# Altium footprint library BARKO_PCBLIB.PcbLib: 531 footprints (part 27 of 34)
Each footprint in its own frame and in the unit in brackets; x right, y up, seen from the top. Pads: shape width x height; smd on the part's side, far side on the other; paste and mask are expansions set on the pad; w line width, h text height; cw(c..) or ccw(c..) is an arc to the next point about the centre after c.
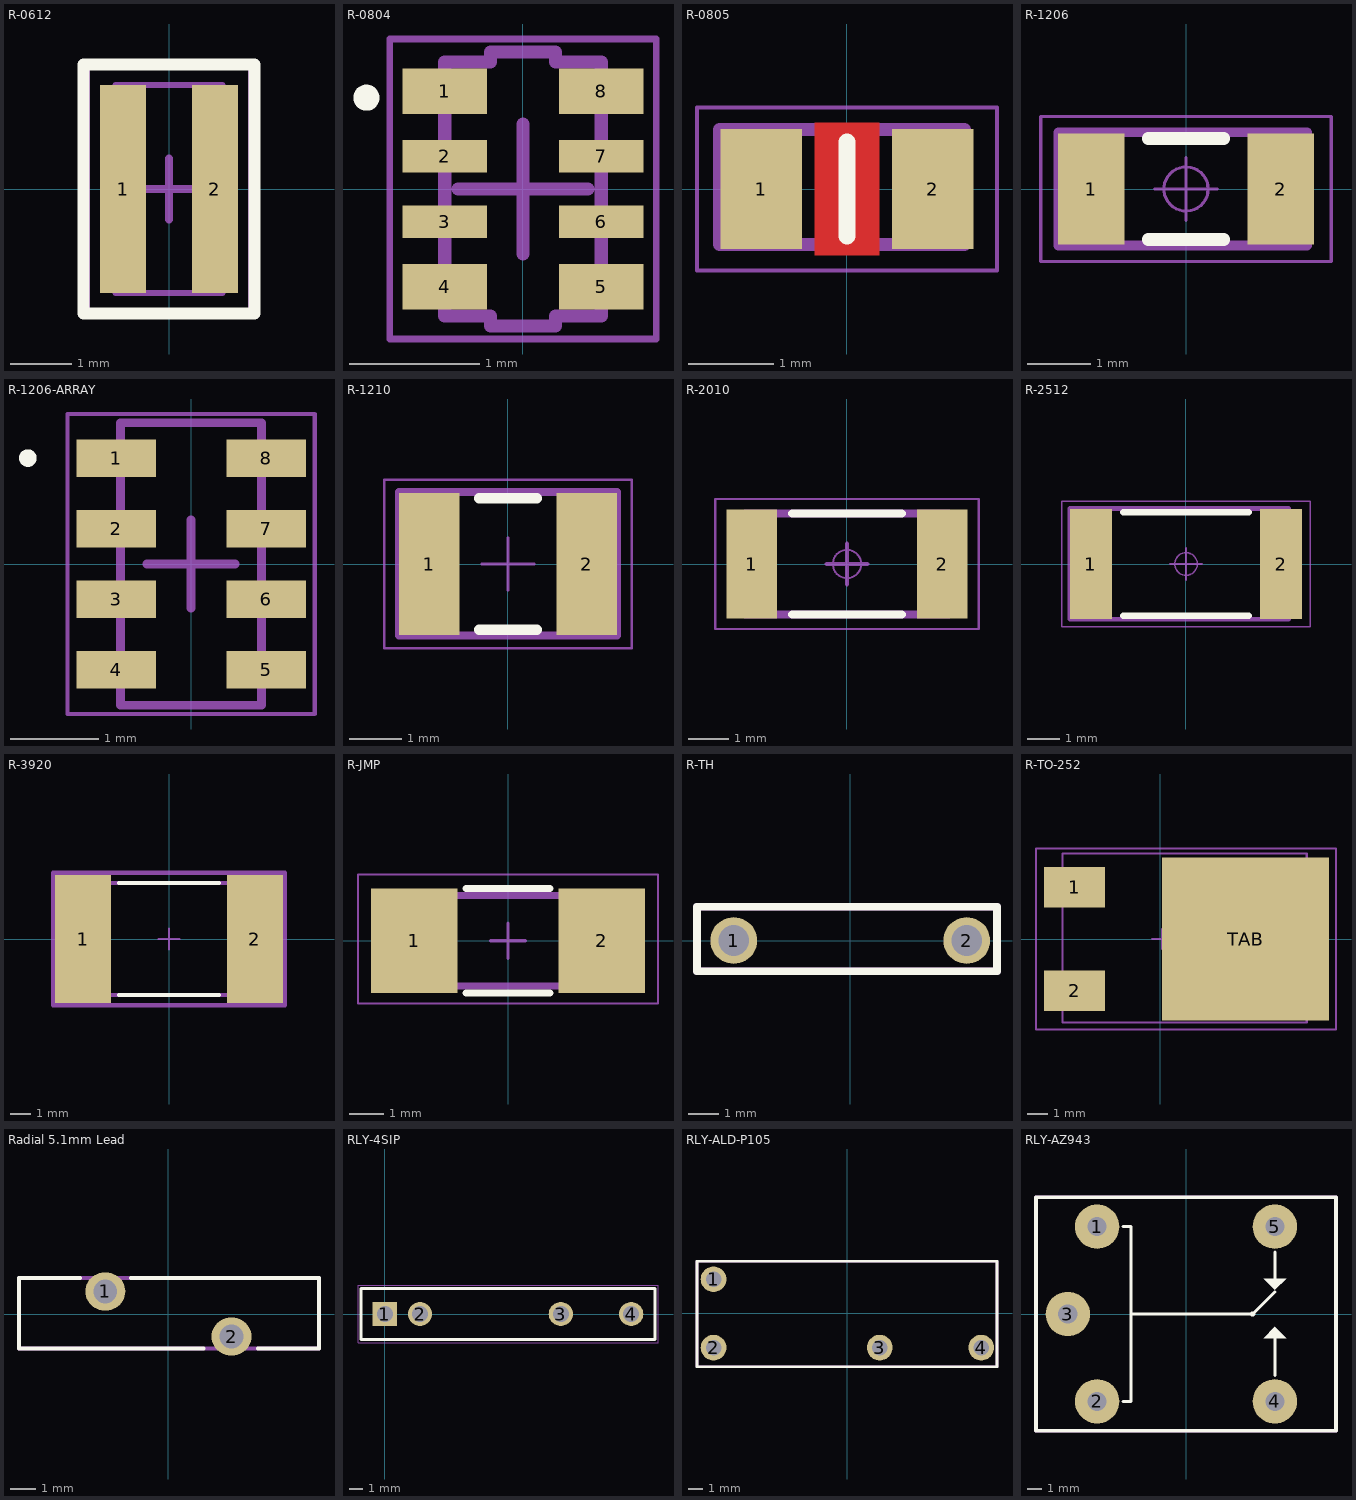
[diagram p26: the footprints below, top view; thin cyan lines are the x and y axes]

## R-0612 [mm] "Chip Resistor, 2-Leads, Body 1,60x3,20mm, IPC Medium Density"
height 0.6
pads (2):
  rect 0.75x3.4 smd: 1(-0.75,0) 2(0.75,0)
Top Overlay:
  lines w0.2: -1.397,-2.032 1.397,-2.032 1.397,2.032 -1.397,2.032 -1.397,-2.032
Mechanical 15:
  lines w0.127: -0.5,0 0.5,0 ; 0,-0.5 0,0.5 ; -1.35,-2.032 1.35,-2.032 1.35,2.032 -1.35,2.032 -1.35,-2.032
ASM Top:
  lines w0.1: -0.875,-1.7 -0.875,1.7 0.875,1.7 0.875,-1.7 -0.875,-1.7
  text ".designator" at 0,-0.186 h0.8
3D body "0612.step": height 0.6, standoff 0, extent -0.875,-1.7 0.875,1.7

## R-0804 [mm] "SMD, 8-Leads, Body 2x1mm, Pitch 0.5mm"
height 0.45
pads (8):
  rect 0.65x0.35 smd mask+0.05: 1(-0.6,0.75) 4(-0.6,-0.75) 5(0.6,-0.75) 8(0.6,0.75)
  rect 0.65x0.25 smd mask+0.05: 2(-0.6,0.25) 3(-0.6,-0.25) 6(0.6,-0.25) 7(0.6,0.25)
Top Overlay:
  circle w0.1: c-1.2,0.7 r0.05
Mechanical 15:
  lines w0.05: -1.02,-1.15 -1.02,1.15 1.02,1.15 1.02,-1.15 -1.02,-1.15
  lines w0.1: -0.5,0 0.5,0 ; 0,-0.5 0,0.5
ASM Top:
  lines w0.1: -0.6,-0.975 -0.6,0.975 -0.25,0.975 -0.25,1.05 0.25,1.05 0.25,0.975 0.6,0.975 0.6,-0.975 0.25,-0.975 0.25,-1.05 -0.25,-1.05 -0.25,-0.975 -0.6,-0.975
  text ".designator" at -0.595,-0.194 h1.2
3D body "CAC-50P200X100-8L.step": height 0.45, standoff 0, extent -0.6,-1.05 0.6,1.05

## R-0805 [mm]
pads (2):
  rect 0.95x1.4 smd: 1(-1,0) 2(1,0)
Top Layer:
  pour cut-out: -0.375,0.775 -0.375,-0.775 0.375,-0.775 0.375,0.775
Top Overlay:
  lines w0.2: 0,-0.55 0,0.55
Mechanical 15:
  lines w0.05: -0.3,0 0.3,0 ; 0,-0.3 0,0.3 ; -1.75,-0.95 -1.75,0.95 1.75,0.95 1.75,-0.95 -1.75,-0.95
ASM Top:
  lines w0.152: -1.488,-0.647 1.371,-0.647 1.371,0.696 -1.488,0.696 -1.488,-0.647
  text ".designator" at -0.776,-0.303 h0.8
3D body "User Library-RES_2013-0805.STEP": height 0.77, standoff 0.01, extent -1.15,-0.675 1.15,0.675

## R-1206 [mm]
pads (2):
  rect 1.05x1.75 smd: 1(-1.5,0.001) 2(1.5,0.001)
Top Overlay:
  lines w0.2: -0.6,-0.799 0.6,-0.799 ; -0.6,0.801 0.6,0.801
Mechanical 15:
  circle w0.05: c0,0.001 r0.35
  lines w0.05: -0.5,0.001 0.5,0.001 ; 0,-0.499 0,0.501 ; -2.3,-1.149 -2.3,1.151 2.3,1.151 2.3,-1.149 -2.3,-1.149
ASM Top:
  lines w0.152: -2.025,-0.894 1.917,-0.894 1.917,0.901 -2.025,0.901 -2.025,-0.894
  text ".designator" at -0.733,-0.291 h0.8
3D body "User Library-RES_3216-1206.STEP": height 0.86, standoff 0.01, extent -1.675,-0.864 1.675,0.866

## R-1206-ARRAY [mm] "SMD, 8-Leads, Body 1.6x3.2mm, Pitch 0.8mm"
height 0.6
pads (8):
  rect 0.9x0.425 smd: 1(-0.85,1.2) 2(-0.85,0.4) 3(-0.85,-0.4) 4(-0.85,-1.2) 5(0.85,-1.2) 6(0.85,-0.4) 7(0.85,0.4) 8(0.85,1.2)
Top Overlay:
  circle w0.1: c-1.85,1.2 r0.05
Mechanical 15:
  lines w0.05: -1.4,-1.7 -1.4,1.7 1.4,1.7 1.4,-1.7 -1.4,-1.7
  lines w0.1: -0.5,0 0.5,0 ; 0,-0.5 0,0.5
ASM Top:
  lines w0.1: -0.8,-1.6 -0.8,1.6 0.8,1.6 0.8,-1.6 -0.8,-1.6
  text ".designator" at -0.399,-0.194 h1.2
3D body "BOUR-CAY16-J4-8.stp": height 0.6, standoff 0, extent -0.8,-1.6 0.8,1.6

## R-1210 [mm]
pads (2):
  rect 1.15x2.7 smd: 1(-1.5,0) 2(1.5,0)
Top Overlay:
  lines w0.2: -0.55,-1.25 0.55,-1.25 ; -0.55,1.25 0.55,1.25
Mechanical 15:
  lines w0.05: -0.5,0 0.5,0 ; 0,-0.5 0,0.5 ; -2.35,-1.6 2.35,-1.6 2.35,1.6 -2.35,1.6 -2.35,-1.6
ASM Top:
  lines w0.152: -2.075,-1.358 2.075,-1.358 2.075,1.367 -2.075,1.367 -2.075,-1.358
  text ".designator" at -0.499,-0.247 h0.8
3D body "User Library-SMD RESISTOR-1.STEP": height 0.61, standoff 0.01, extent -1.6,-1.25 1.6,1.25

## R-2010 [mm]
height 0.65
pads (2):
  rect 1.25x2.7 smd: 1(-2.35,0) 2(2.35,0)
Top Overlay:
  lines w0.2: -1.35,-1.25 1.35,-1.25 ; -1.35,1.25 1.35,1.25
Mechanical 15:
  circle w0.05: c0,0 r0.35
  lines w0.05: -0.5,0 0.5,0 ; 0,-0.5 0,0.5 ; -3.25,-1.6 3.25,-1.6 3.25,1.6 -3.25,1.6 -3.25,-1.6
Mechanical 16:
  lines w0.1: -0.5,0 0.5,0 ; 0,-0.5 0,0.5
ASM Top:
  lines w0.2: -2.5,-1.25 -2.5,1.25 2.5,1.25 2.5,-1.25 -2.5,-1.25
  text ".designator" at -0.47,-0.181 h0.8
3D body "Res_TE_CRGP2010F820K_eec.STEP": height 0.65, standoff 0, extent -2.5,-1.25 2.5,1.25

## R-2512 [mm]
pads (2):
  rect 1.3x3.4 smd: 1(-2.95,0) 2(2.95,0)
Top Overlay:
  lines w0.2: -1.95,-1.6 1.95,-1.6 ; -1.95,1.6 1.95,1.6
Mechanical 15:
  circle w0.05: c0,0 r0.35
  lines w0.05: -0.5,0 0.5,0 ; 0,-0.5 0,0.5 ; -3.85,-1.95 3.85,-1.95 3.85,1.95 -3.85,1.95 -3.85,-1.95
ASM Top:
  lines w0.152: -3.6,-1.712 3.185,-1.712 3.185,1.725 -3.6,1.725 -3.6,-1.712
  text ".designator" at -0.85,-0.429 h0.8
3D body "RESC6332X80N.stp": height 0.8, standoff 0, extent -3.125,-1.6 3.125,1.6

## R-3920 [mm]
pads (2):
  rect 2.7x6.2 smd paste+0 mask+0: 1(-4.15,0) 2(4.15,0)
Top Overlay:
  lines w0.2: -2.425,-2.7 2.425,-2.7 ; -2.425,2.7 2.425,2.7
Mechanical 15:
  lines w0.2: -5.6,-3.2 5.6,-3.2 5.6,3.2 -5.6,3.2 -5.6,-3.2
Mechanical 16:
  lines w0.1: -0.5,0 0.5,0 ; 0,-0.5 0,0.5
ASM Top:
  lines w0.2: -5.2,-2.7 -5.2,2.7 5.2,2.7 5.2,-2.7 -5.2,-2.7
  text ".Designator" at 0,0.188 h1
3D body "Res_Stackpole_Electronics_HCS3920FT1L00_eec.STEP": height 1.07, standoff 0, extent -5.1,-2.6 5.1,2.6

## R-JMP [mm] "Chip Resistor, 2-Leads, Body 6.85x2.00mm, IPC Medium Density"
height 0.97
pads (2):
  rect 2.475x3 smd: 1(-2.688,0) 2(2.688,0)
Top Overlay:
  lines w0.2: -1.2,-1.5 1.2,-1.5 ; -1.2,1.5 1.2,1.5
Mechanical 15:
  lines w0.05: -4.3,-1.8 4.3,-1.8 4.3,1.9 -4.3,1.9 -4.3,-1.8
  lines w0.1: -0.5,0 0.5,0 ; 0,-0.5 0,0.5
ASM Top:
  lines w0.2: -3.4,-1.3 3.3,-1.3 3.3,1.3 3.1,1.3 -3.4,1.3 -3.4,-1.3
  text ".designator" at -0.5,-0.3 h0.8
3D body "s1911-46r.stp": height 0.98, standoff 0.01, extent -3.425,-1.25 3.425,1.257

## R-TH [mil]
pads (2):
  round 60 hole 39.37: 1(-149.61,0) 2(150,0)
Top Overlay:
  lines w10: -196.85,-39.37 -196.85,43.31 188.98,43.31 188.98,-39.37 -196.85,-39.37
Bottom Overlay:
  lines w10: -196.85,-39.37 -196.85,43.31 188.98,43.31 188.98,-39.37 -196.85,-39.37
Top 3D Body:
  lines w10: -196.85,-39.37 -196.85,0 -196.85,43.31 188.98,43.31 188.98,-39.37 -196.85,-39.37
ASM Top:
  lines w5.91: -196.85,-39.37 188.98,-39.37 188.98,43.31 -196.85,43.31 -196.85,-39.37
  text ".designator" at -31.5,-11.81 h31.5
3D body "CircuitWorks-RESISTOR 7_62MM DIP.STEP": height 157.98, standoff 0.5, extent -157.48,-39.37 161.42,39.37

## R-TO-252 [mm]
pads (3):
  rect 3x2 smd paste-0.05: 1(-4.2,2.54) 2(-4.2,-2.54)
  rect 8.2x8 smd paste-10: TAB(4.2,0)
Top Paste:
  rectangle: 5.715,2.159 8.128,3.683
  rectangle: 5.715,0.212 8.128,1.736
  rectangle: 5.715,-1.736 8.128,-0.212
  rectangle: 5.715,-3.683 8.128,-2.159
  rectangle: 2.984,2.159 5.397,3.683
  rectangle: 2.984,0.212 5.397,1.736
  rectangle: 2.984,-1.736 5.397,-0.212
  rectangle: 2.984,-3.683 5.397,-2.159
  rectangle: 0.254,-3.683 2.667,-2.159
  rectangle: 0.254,-1.736 2.667,-0.212
  rectangle: 0.254,0.212 2.667,1.736
  rectangle: 0.254,2.159 2.667,3.683
Mechanical 15:
  lines w0.1: -0.4,0 0.6,0 ; 0.1,-0.5 0.1,0.5 ; -6.096,-4.445 8.636,-4.445 8.636,4.445 -6.096,4.445 -6.096,-4.445
ASM Top:
  lines w0.1: -4.8,-4.1 -4.8,4.2 7.2,4.2 7.2,-4.1 -4.8,-4.1
  text ".designator" at 0,0 h0.8
3D body "TKH45PR500JE-TR.stp": height 0.92, standoff 0.01, extent -4.78,-4.15 7.22,4.15

## Radial 5.1mm Lead [mm] "Poly Puse"
pads (2):
  oval 1.6x1.524 hole 0.95: 1(-2.525,0.903) 2(2.525,-0.903)
Top Overlay:
  lines w0.152: -3.527,1.436 -5.976,1.436 -5.976,-1.383 ; -1.503,1.434 -1.501,1.436 6.024,1.436 6.024,-1.383 3.576,-1.383 3.573,-1.38 ; 1.41,-1.384 -5.976,-1.384 ; -5.976,-1.383 -5.976,-1.384
ASM Top:
  lines w0.15: -5.976,1.436 6.024,1.436 6.024,-1.383 -5.976,-1.383 -5.976,1.4 ; -5.976,1.4 -5.976,1.4
  text ".designator" at -1,-0.1 h0.8
3D body "User Library-MF-R250.STEP": height 18.3, standoff -7.6, extent -5.976,-1.383 6.024,1.436

## RLY-4SIP [mm]
pads (4):
  rect 1.75x1.75 hole 1.15: 1(0,0)
  round 1.75 hole 1.15: 2(2.54,0) 3(12.7,0) 4(17.78,0)
Top Overlay:
  lines w0.2: -1.71,-1.85 -1.71,1.85 19.49,1.85 19.49,-1.85 -1.71,-1.85
Mechanical 15:
  lines w0.05: -1.935,-2.075 -1.935,2.075 19.715,2.075 19.715,-2.075 -1.935,-2.075
ASM Top:
  lines w0.1: -1.71,-1.85 19.49,-1.85 19.49,1.85 -1.71,1.85 -1.71,-1.85
  text ".designator" at 7.1,0 h1.5
3D body: height 12.6, standoff 1.4, extent -1.71,-1.85 19.49,1.85

## RLY-ALD-P105 [mil]
pads (4):
  round 70 hole 42: 1(-364,93) 2(-364,-93) 3(88,-93) 4(364,-93)
Top Overlay:
  lines w8: -409,-145 -409,142 403,142 407,142 407,-145 -409,-145
ASM Top:
  lines w8: -409,-145 -409,142 407,142 407,-145 -409,-145
  text ".designator" at -301,-11 h31.5
3D body: height 602.36, standoff 11.81, extent -400.54,-146.73 406.54,136.74

## RLY-AZ943 [mil]
pads (5):
  round 120 hole 52: 1(-240,236) 2(-240,-236) 3(-319,0) 4(240,-236) 5(240,236)
Top Overlay:
  circle w4: c180,0 r5.39
  region: 270,-65 240,-35 210,-65
  region: 279,95
  region: 210,95 240,65 270,95
  lines w8: -170,-236 -149,-236 -149,236 -170,236 ; -147,0 180,0 240,60 ; 240,-166 240,-64 ; 240,94 240,114 240,167
  lines w10: -405,-315 -405,315 405,315 405,-315 -405,-315
ASM Top:
  lines w10: -405,315 405,315 405,-315 -405,-315 -405,314 -404,315
  text ".designator" at -244,78 h31.5
3D body "AZ943-1CH-5DE-Relay.step": height 602.36, standoff -196.85, extent -376,-305.23 375.97,305